# Altium footprint library myPcbLib.PcbLib: 987 footprints (part 11 of 62)
Each footprint in its own frame and in the unit in brackets; x right, y up, seen from the top. Pads: shape width x height; smd on the part's side, far side on the other; paste and mask are expansions set on the pad; w line width, h text height; cw(c..) or ccw(c..) is an arc to the next point about the centre after c.
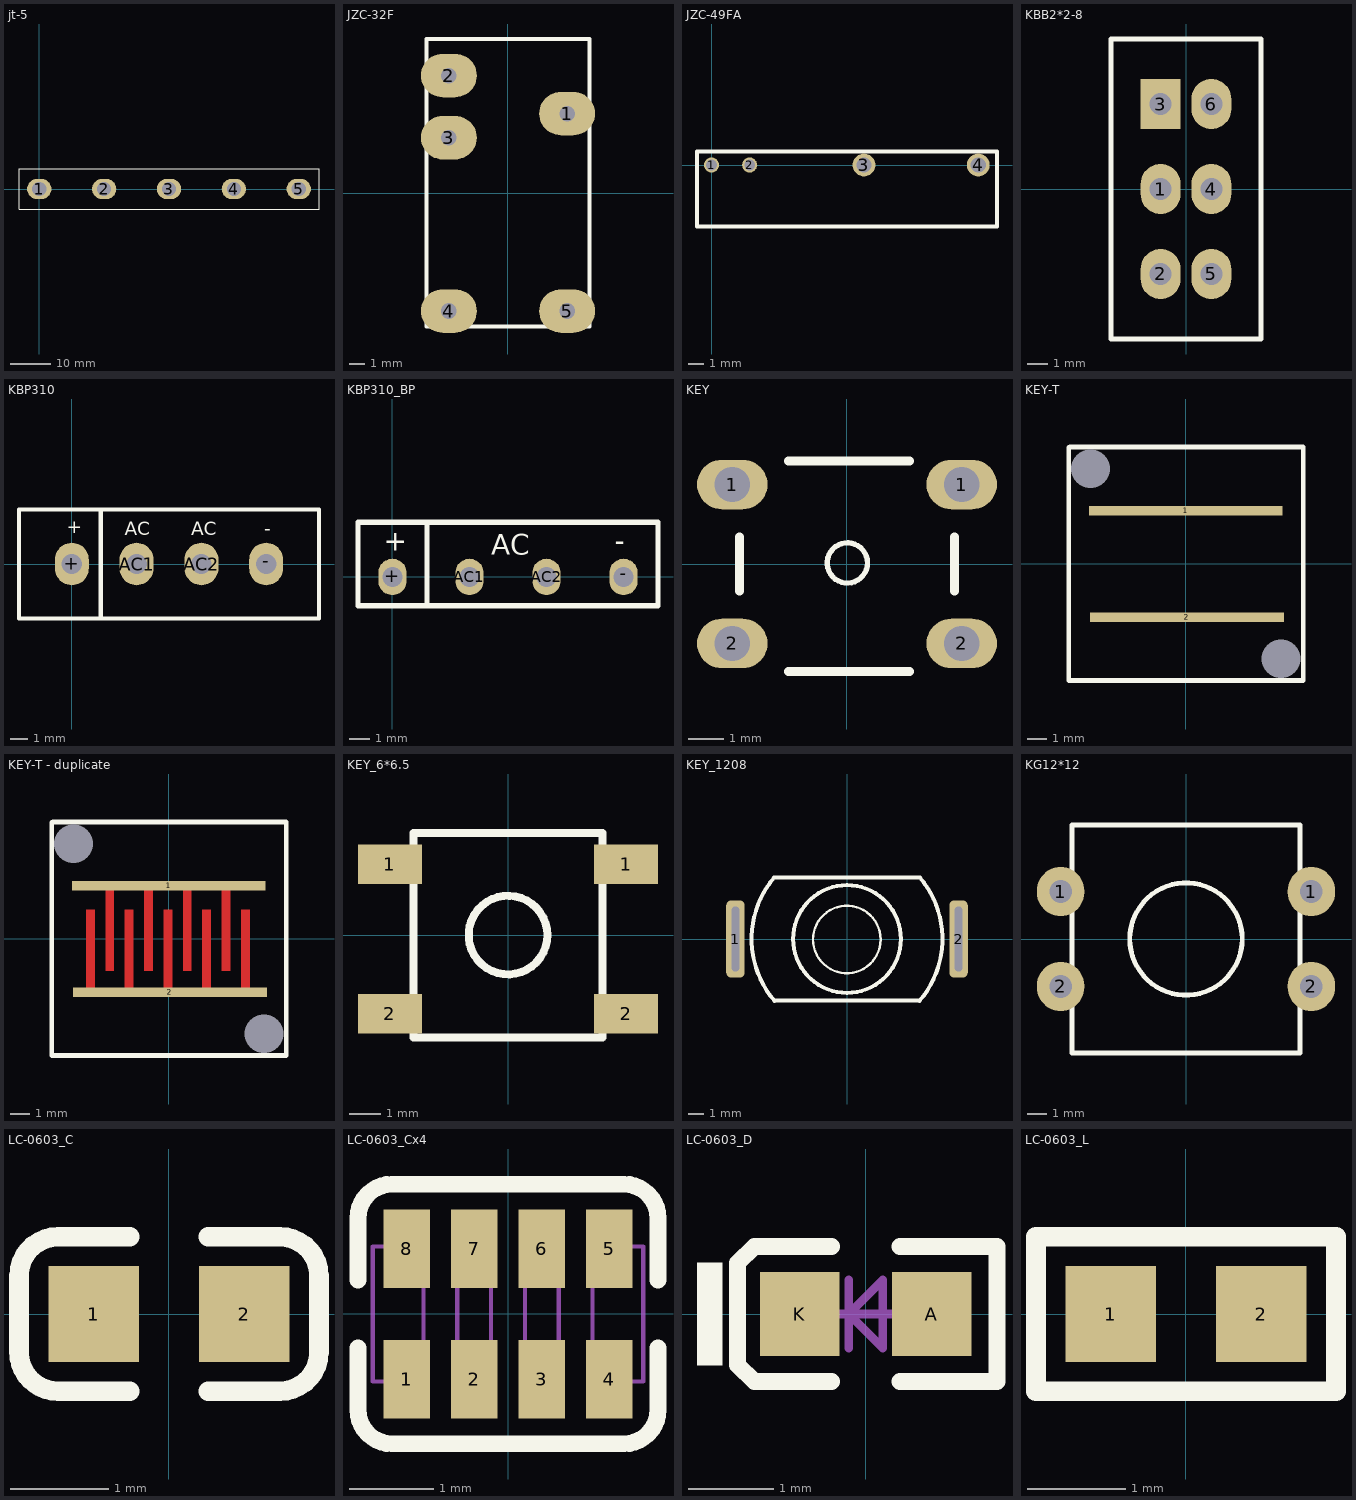
[diagram p10: the footprints below, top view; thin cyan lines are the x and y axes]

## jt-5 [mm]
pads (5):
  oval 6x5 hole 3.5: 1(0,0) 2(16,0) 3(32,0) 4(48,0) 5(64,0)
Top Overlay:
  lines w0.254: -5,-5 -5,5 69,5 69,-5 -5,-5

## JZC-32F [mm]
pads (5):
  oval 3.6x2.8 hole 1: 1(3.8,5.125) 2(-3.8,7.575) 3(-3.8,3.575) 4(-3.8,-7.575) 5(3.8,-7.575)
Top Overlay:
  lines w0.254: -5.25,-8.575 -5.25,9.925 5.25,9.925 5.25,-8.575 -5.25,-8.575

## JZC-49FA [mil]
height 590.55
pads (4):
  round 40 hole 28: 1(0,0) 2(100,0)
  round 60 hole 40: 3(400,0) 4(700,0)
Top Overlay:
  lines w10: -38.19,-161.42 -38.19,35.43 749.21,35.43 749.21,-161.42 -38.19,-161.42

## KBB2*2-8 [mm]
pads (6):
  oval 2x2.5 hole 1.1: 1(-1.27,0) 2(-1.27,-4.25) 4(1.27,0) 5(1.27,-4.25) 6(1.27,4.25)
  rect 2x2.5 hole 1.1: 3(-1.27,4.25)
Top Overlay:
  lines w0.254: -3.75,-7.5 -3.75,7.5 3.55,7.5 3.75,7.5 3.75,-7.5 -3.75,-7.5

## KBP310 [mm]
height 12.8
pads (4):
  oval 2x2.5 hole 1.2: +(0,0) -(11.4,0) AC1(3.8,0) AC2(7.6,0)
Top Overlay:
  lines w0.254: -1.4,3.2 14.1,3.2 -3.1,3.2 -3.1,-3.2 8.8,-3.2 14.5,-3.2 14.5,3.2 12.8,3.2 ; 1.7,-3.2 1.7,3.2 2,3.2
  text "AC" at 7,1.7 h0.8
  text "AC" at 3.1,1.7 h0.8
  text "-" at 11.3,1.7 h0.8
  text "+" at -0.3,1.8 h0.8

## KBP310_BP [mm]
pads (4):
  oval 1.4x1.8 hole 1: +(0,0) -(11.4,0) AC1(3.8,0) AC2(7.6,0)
Top Overlay:
  lines w0.254: 1.7,-1.3 1.7,2.7 ; -1.7,-1.422 -1.7,2.7 13.1,2.7 13.1,-1.422 -1.7,-1.422
  text "-" at 10.973,1.295 h1
  text "AC" at 4.877,1.092 h1
  text "+" at -0.432,1.295 h1

## KEY [mm]
height 10
pads (4):
  oval 2x1.4 hole 1: 1(-3.25,2.25) 1(3.25,2.25) 2(-3.25,-2.25) 2(3.25,-2.25)
Top Overlay:
  circle w0.15: c0.01,0.03 r0.57
  lines w0.254: -3.048,-0.762 -3.048,0.762 ; -1.651,2.921 1.778,2.921 ; 3.048,-0.762 3.048,0.762 ; -1.651,-3.048 1.778,-3.048 0.635,-3.048 -1.651,-3.048

## KEY-T [mm]
pads (4):
  rect 10x0.5 smd: 1(0.003,2.73) 2(0.063,-2.754)
  round 0 hole 2 unplated: " "(-4.912,4.9) " "(4.913,-4.9)
Top Overlay:
  lines w0.25: -6.042,6.013 -6.042,-6.031 6.066,-6.031 6.066,5.981 ; -5.967,6.032 6.066,6.032

## KEY-T - duplicate [mm]
pads (4):
  rect 10x0.5 smd: 1(0.003,2.73) 2(0.063,-2.754)
  round 0 hole 2 unplated: " "(-4.912,4.9) " "(4.913,-4.9)
Top Layer:
  rectangle: 3.727,-2.959 4.184,1.511
  rectangle: 2.727,-1.664 3.184,2.807
  rectangle: 1.727,-2.959 2.184,1.511
  rectangle: 0.727,-1.664 1.184,2.807
  rectangle: -0.273,-2.959 0.184,1.511
  rectangle: -1.273,-1.664 -0.816,2.807
  rectangle: -2.273,-2.959 -1.816,1.511
  rectangle: -3.273,-1.664 -2.816,2.807
  rectangle: -4.273,-2.959 -3.816,1.511
Top Overlay:
  lines w0.25: -6.042,6.013 -6.042,-6.031 6.066,-6.031 6.066,5.981 ; -5.967,6.032 6.066,6.032

## KEY_6*6.5 [mm]
pads (4):
  rect 2.032x1.27 smd: 1(-3.75,2.25) 1(3.75,2.25) 2(-3.75,-2.5) 2(3.75,-2.5)
Top Overlay:
  circle w0.254: c0,0 r1.25
  lines w0.254: 0,-3.25 3,-3.25 3,3.25 -3,3.25 -3,-3.25 0.25,-3.25

## KEY_1208 [mm]
height 3
pads (2):
  rrect50% 1.2x5 hole 0.5 slot 4.2 at 90 deg: 1(-7.25,0) 2(7.25,0)
Top Overlay:
  circle w0.15: c-0.01,-0.03 r2.194
  circle w0.254: c0,0 r3.501
  lines w0.254: -4.742,3.994 ccw(c0,0) -4.722,-4.018 ; -4.7,-4 4.7,-4 ; -4.7,4 4.7,4 ; 4.722,-4.018 ccw(c0,0) 4.742,3.994

## KG12*12 [mm]
pads (4):
  oval 2.5x2.6 hole 1.2: 1(-6.604,2.5) 1(6.604,2.5) 2(-6.604,-2.5) 2(6.604,-2.5)
Top Overlay:
  circle w0.254: c0,0 r2.962
  lines w0.254: -6,-6 6,-6 6,6 -6,6 -6,-6

## LC-0603_C [mm]
pads (2):
  rect 0.93x0.98 smd: 1(-0.77,0) 2(0.77,0)
Top Overlay:
  lines w0.2: -0.4,-0.79 -1.135,-0.79 cw(c-1.135,-0.39) -1.535,-0.39 -1.535,0.39 cw(c-1.135,0.39) -1.135,0.79 -0.4,0.79 ; 0.4,-0.79 1.135,-0.79 ccw(c1.135,-0.39) 1.535,-0.39 1.535,0.39 ccw(c1.135,0.39) 1.135,0.79 0.4,0.79
3D body "User Library-0603 SMD Capacitor.STEP": height 0.3, standoff 0, extent -0.8,-0.4 0.8,0.4

## LC-0603_Cx4 [mm]
pads (8):
  rect 0.55x0.93 smd mask+0.051: 1(-1.2,-0.77) 2(-0.4,-0.77) 3(0.4,-0.77) 4(1.2,-0.77) 5(1.2,0.77) 6(0.4,0.77) 7(-0.4,0.77) 8(-1.2,0.77)
Top Overlay:
  lines w0.2: -1.775,-0.4 -1.775,-1.135 ccw(c-1.375,-1.135) -1.375,-1.535 1.375,-1.535 ccw(c1.375,-1.135) 1.775,-1.135 1.775,-0.4 ; -1.775,0.4 -1.775,1.135 cw(c-1.375,1.135) -1.375,1.535 1.375,1.535 cw(c1.375,1.135) 1.775,1.135 1.775,0.4
Mechanical 13:
  lines w0.05: -1.6,-0.8 -1,-0.8 -1,0.8 -1.6,0.8 -1.6,-0.8 ; -0.6,-0.8 -0.2,-0.8 -0.2,0.8 -0.6,0.8 -0.6,-0.8 ; 0.2,-0.8 0.6,-0.8 0.6,0.8 0.2,0.8 0.2,-0.8 ; 1,-0.8 1.6,-0.8 1.6,0.8 1,0.8 1,-0.8

## LC-0603_D [mm]
pads (2):
  rect 0.93x0.98 smd: A(0.77,0) K(-0.77,0)
Top Overlay:
  rectangle: -1.975,-0.6 -1.675,0.6
  lines w0.2: -0.4,-0.79 -1.3,-0.79 -1.5,-0.597 -1.5,0.597 -1.3,0.79 -0.4,0.79 ; 0.4,-0.79 1.535,-0.79 1.535,0.79 0.4,0.79
Mechanical 13:
  lines w0.1: -0.4,0 0.4,0 ; -0.2,-0.4 -0.2,0.4 ; -0.2,0 0.2,-0.4 0.2,0.4 -0.2,0
3D body "User Library-LED_0603_R.STEP": height 0.6, standoff 0, extent -0.8,-0.4 0.8,0.4

## LC-0603_L [mm]
pads (2):
  rect 0.93x0.98 smd: 1(-0.77,0) 2(0.77,0)
Top Overlay:
  lines w0.2: -1.535,-0.79 -1.535,0.79 1.535,0.79 1.535,-0.79 -1.535,-0.79
3D body "L0603.STEP": height 0.46, standoff -0.01, extent -0.825,-0.412 0.825,0.413